# Altium footprint library 模块封装库.PcbLib: 20 footprints (part 2 of 2)
Each footprint in its own frame and in the unit in brackets; x right, y up, seen from the top. Pads: shape width x height; smd on the part's side, far side on the other; paste and mask are expansions set on the pad; w line width, h text height; cw(c..) or ccw(c..) is an arc to the next point about the centre after c.
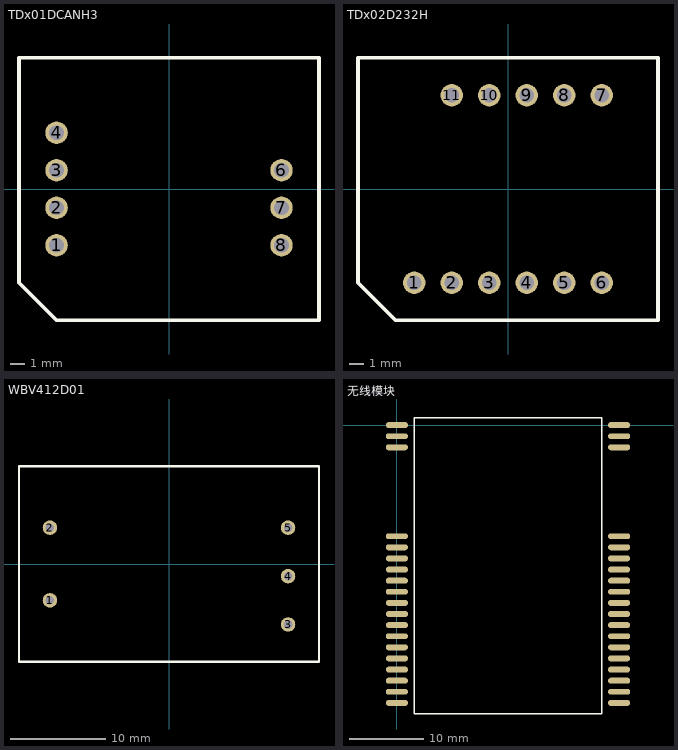
[diagram p1: the footprints below, top view; thin cyan lines are the x and y axes]

## TDx01DCANH3 [mil]
height 275.59
pads (7):
  round 60 hole 39.37: 1(-300,-150) 2(-300,-50) 3(-300,50) 4(-300,150) 6(300,50) 7(300,-50) 8(300,-150)
Top Overlay:
  lines w10: -400,-250 -300,-350 400,-350 400,350 -400,350 -400,-250
3D body: height 295.28, standoff -78.74, extent -400,-334.65 387.4,334.65

## TDx02D232H [mil]
height 275.59
pads (11):
  round 60 hole 39.37: 1(-250,-250) 2(-150,-250) 3(-50,-250) 4(50,-250) 5(150,-250) 6(250,-250) 7(250,250) 8(150,250) 9(50,250) 10(-50,250) 11(-150,250)
Top Overlay:
  lines w10: -400,-250 -300,-350 400,-350 400,350 -400,350 -400,-250
3D body: height 295.28, standoff -78.74, extent -392.91,-330.32 394.49,338.98

## WBV412D01 [mm] "交流电流传感器"
height 22.5
pads (5):
  round 1.524 hole 0.9: 1(-12.5,-3.81) 2(-12.5,3.81) 3(12.5,-6.35) 4(12.5,-1.27) 5(12.5,3.81)
Top Overlay:
  lines w0.254: -15.75,-10.25 15.75,-10.25 15.75,10.25 -15.75,10.25 -15.75,-10.25

## 无线模块 [mm]
pads (38):
  oval 3x0.8 smd: J1_1(0,0) J1_2(0,-1.5) J1_3(0,-3) J2_1(30,0) J2_2(30,-1.5) J2_3(30,-3) P1_1(30,-15) P1_2(30,-16.5) P1_3(30,-18) P1_4(30,-19.5) P1_5(30,-21) P1_6(30,-22.5) P1_7(30,-24) P1_8(30,-25.5) P1_9(30,-27) P1_10(30,-28.5) P1_11(30,-30) P1_12(30,-31.5) P1_13(30,-33) P1_14(30,-34.5) P1_15(30,-36) P1_16(30,-37.5) P2_1(0,-37.5) P2_2(0,-36) P2_3(0,-34.5) P2_4(0,-33) P2_5(0,-31.5) P2_6(0,-30) P2_7(0,-28.5) P2_8(0,-27) P2_9(0,-25.5) P2_10(0,-24) P2_11(0,-22.5) P2_12(0,-21) P2_13(0,-19.5) P2_14(0,-18) P2_15(0,-16.5) P2_16(0,-15)
Top Overlay:
  lines w0.2: 2.335,-39 2.335,1 14.625,1 27.665,1 27.665,-39 2.335,-39